# Altium footprint library controller_8266.PcbLib: 17 footprints (part 1 of 2)
Each footprint in its own frame and in the unit in brackets; x right, y up, seen from the top. Pads: shape width x height; smd on the part's side, far side on the other; paste and mask are expansions set on the pad; w line width, h text height; cw(c..) or ccw(c..) is an arc to the next point about the centre after c.
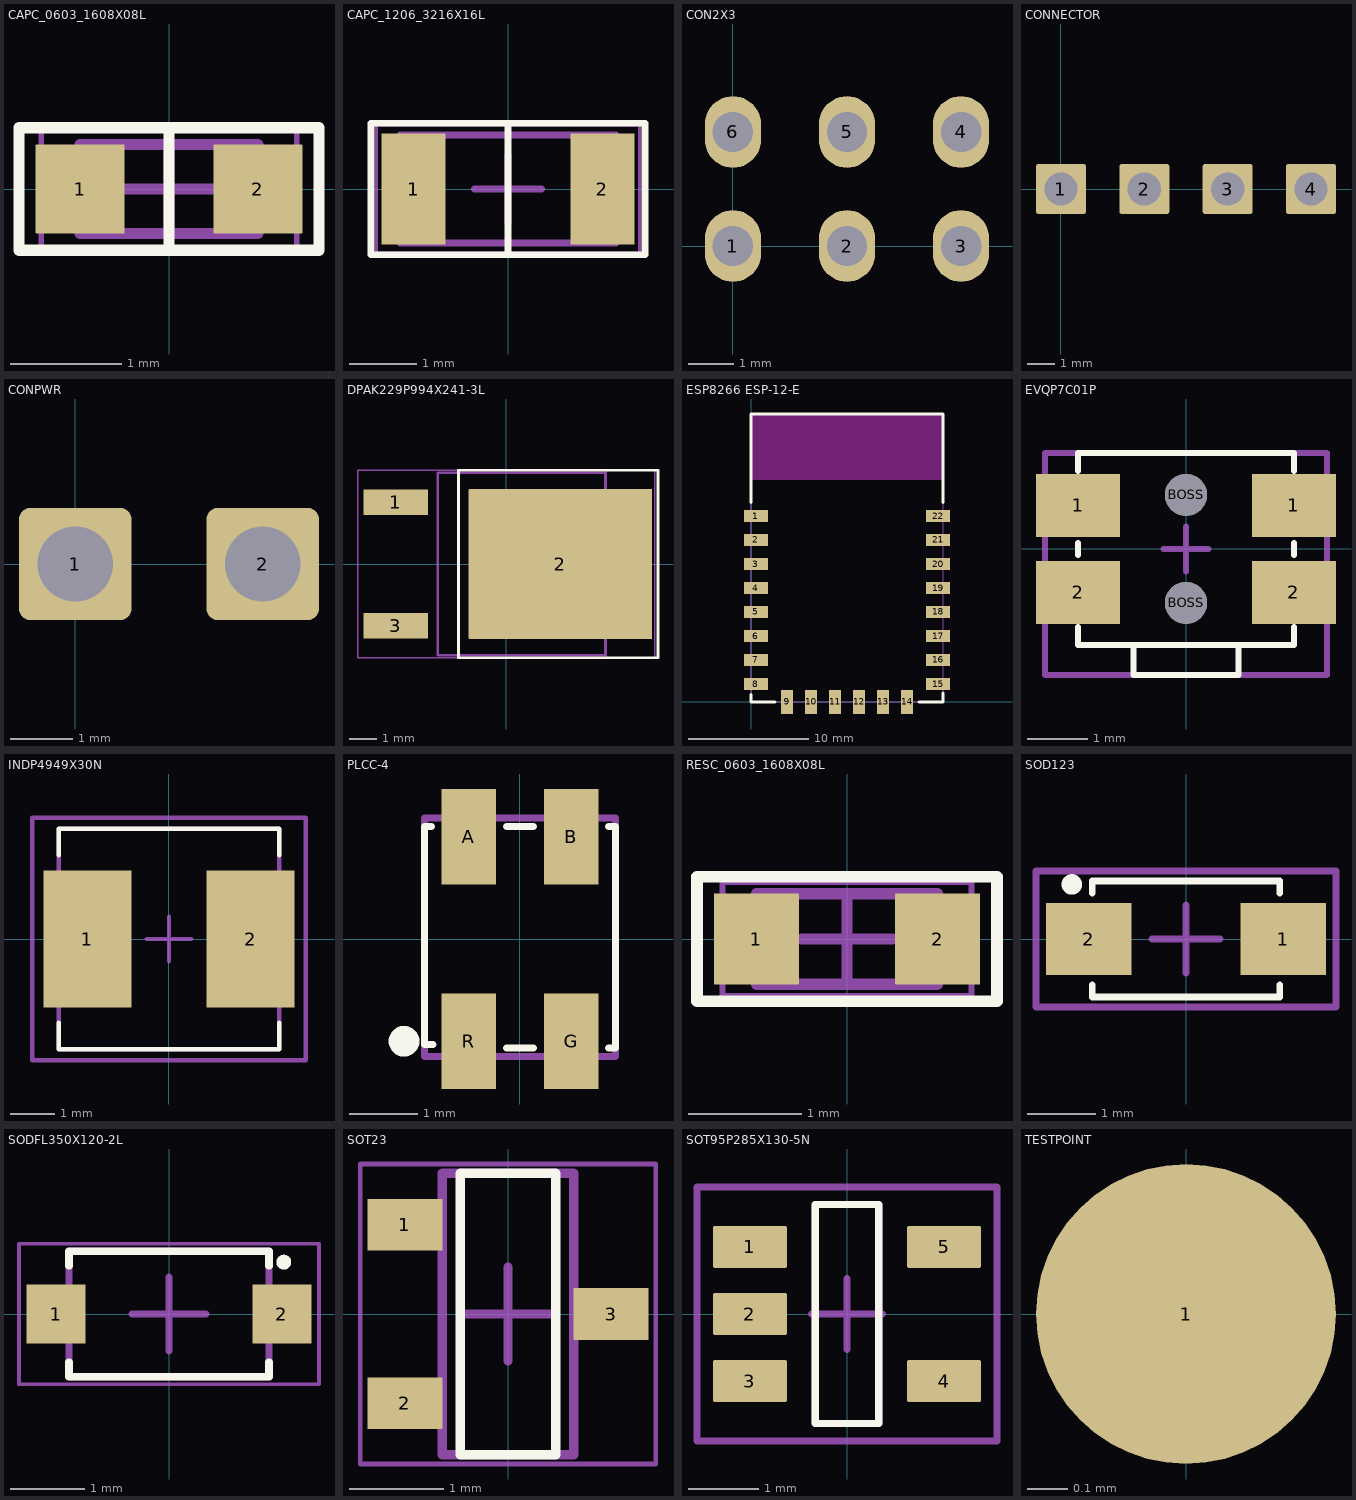
[diagram p0: the footprints below, top view; thin cyan lines are the x and y axes]

## CAPC_0603_1608X08L [mm] "Chip Capacitor 0603"
height 0.8
pads (2):
  rrect1% 0.8x0.8 smd: 1(-0.8,0) 2(0.8,0)
Top Overlay:
  lines w0.102: 0,-0.55 0,0.55 ; -1.35,-0.55 1.35,-0.55 1.35,0.55 -1.35,0.55 -1.35,-0.55
Top Courtyard:
  lines w0.05: -1.15,-0.55 1.15,-0.55 1.15,0.55 -1.15,0.55 -1.15,-0.55
  lines w0.1: -0.4,0 0.4,0 ; 0,-0.4 0,0.4
Top Component Outline:
  lines w0.1: -0.8,-0.4 0.8,-0.4 0.8,0.4 -0.8,0.4 -0.8,-0.4
3D body "CAPC_0603_1608X08L.step": height 0.8, standoff 0, extent -0.8,-0.4 0.8,0.4

## CAPC_1206_3216X16L [mm] "Chip Capacitor 1206"
height 1.6
pads (2):
  rrect1% 0.95x1.65 smd: 1(-1.4,0) 2(1.4,0)
Top Overlay:
  lines w0.102: 0,-0.975 0,0.975 ; -2.032,-0.975 2.032,-0.975 2.032,0.975 -2.032,0.975 -2.032,-0.975
Top Courtyard:
  lines w0.05: -1.95,-0.95 -1.95,0.95 1.95,0.95 1.95,-0.95 -1.95,-0.95
  lines w0.1: -0.5,0 0.5,0 ; 0,-0.5 0,0.5
Top Component Outline:
  lines w0.102: -1.6,-0.8 1.6,-0.8 1.6,0.8 -1.6,0.8 -1.6,-0.8
3D body "CAPC_1206_3216X16L.step": height 1.6, standoff 0, extent -1.6,-0.8 1.6,0.8

## CON2X3 [mm] "2x3 2.54mm"
pads (6):
  oval 1.25x1.6 hole 0.9 paste+0 mask+0: 1(0,0) 2(2.54,0) 3(5.08,0) 4(5.08,2.54) 5(2.54,2.54) 6(0,2.54)

## CONNECTOR [mm]
pads (4):
  rrect10% 1.8x1.8 hole 1.2 paste+0: 1(0,0) 2(3,0) 3(6,0) 4(9,0)

## CONPWR [mm]
pads (2):
  rrect20% 1.8x1.8 hole 1.2 paste+0: 1(0,0) 2(3,0)

## DPAK229P994X241-3L [mm] "D-PAK, 3-Pads, Body 6.21x6.73mm (max), IPC High Density"
height 2.41
pads (3):
  rrect1% 2.4x0.95 smd: 1(-4.1,2.29) 3(-4.1,-2.29)
  rrect1% 6.8x5.55 smd: 2(2,0)
Top Overlay:
  lines w0.102: -1.778,-3.475 5.613,-3.475 5.613,3.475 -1.778,3.475 -1.778,-3.475
Top Courtyard:
  lines w0.05: -5.5,-3.475 -5.5,3.475 5.5,3.475 5.5,-3.475 -5.5,-3.475
  lines w0.1: -0.5,0 0.5,0 ; 0,-0.5 0,0.5
Top Component Outline:
  lines w0.1: -2.55,-3.375 3.67,-3.375 3.67,3.375 -2.55,3.375 -2.55,-3.375
3D body "DPAK229P994X241-3L.step": height 2.56, standoff 0, extent -4.695,-3.375 5.245,3.375

## ESP8266 ESP-12-E [mm] "ESP8266 ESP-12-E"
pads (22):
  rrect1% 2x1 smd: 1(0.4,15.5) 2(0.4,13.5) 3(0.4,11.5) 4(0.4,9.5) 5(0.4,7.5) 6(0.4,5.5) 7(0.4,3.5) 8(0.4,1.5) 15(15.6,1.5) 16(15.6,3.5) 17(15.6,5.5) 18(15.6,7.5) 19(15.6,9.5) 20(15.6,11.5) 21(15.6,13.5) 22(15.6,15.5)
  rrect1% 1x2 smd: 9(3,0) 10(5,0) 11(7,0) 12(9,0) 13(11,0) 14(13,0)
Top Overlay:
  lines w0.254: 0,0.635 0,0 2,0 ; 0,16.637 0,24 16,24 16,16.637 ; 14,0 16,0 16,0.762
Keep-Out Layer:
  rectangle: 0,18.49 16,24
Top Courtyard:
  lines w0.025: 0,0 16,0 16,24 0,24 0,0
Top Component Outline:
  lines w0.102: 0,0 16,0 16,24 0,24 0,0
3D body "ESP-12F.STEP": height 3.17, standoff 0, extent 0,0 16,24

## EVQP7C01P [mm] "Side actuated tactile switch"
height 1.35
pads (6):
  rrect1% 1.4x1.05 smd mask+0.05: 1(-1.8,0.725) 1(1.8,0.725) 2(-1.8,-0.725) 2(1.8,-0.725)
  round 0.7 hole 0.7 unplated: BOSS(0,-0.9) BOSS(0,0.9)
Top Overlay:
  lines w0.102: -1.8,-1.3 -1.8,-1.6 1.8,-1.6 1.8,-1.3 ; -1.8,-0.1 -1.8,0.1 ; -1.8,1.3 -1.8,1.594 1.8,1.594 1.8,1.3 ; -0.875,-1.6 -0.875,-2.1 0.875,-2.1 0.875,-1.6 ; 1.8,-0.1 1.8,0.1
Top Courtyard:
  lines w0.102: -0.375,0 0.375,0 ; 0,-0.375 0,0.375 ; -2.35,-2.1 2.35,-2.1 2.35,1.594 -2.35,1.594 -2.35,-2.1
Top Component Outline:
  lines w0.102: -2.35,-2.1 2.35,-2.1 2.35,1.594 -2.35,1.594 -2.35,-2.1
3D body "EVQP7-LC-01P_FIXED.step": height 1.5, standoff -0.35, extent -2.35,-2.1 2.35,1.594

## INDP4949X30N [mm] "Precision Wire Wound Inductor, 2-Leads, Body 4.90x4.90mm, IPC Medium Density"
height 3
pads (2):
  rect 2x3.1 smd: 1(-1.85,0) 2(1.85,0)
Top Overlay:
  lines w0.102: -2.5,-1.901 -2.5,-2.5 2.5,-2.5 2.5,-1.901 ; -2.5,1.901 -2.5,2.5 2.5,2.5 2.5,1.901
Top Courtyard:
  lines w0.1: -0.5,0 0.5,0 ; 0,-0.5 0,0.5
  lines w0.102: -3.1,-2.75 -3.1,2.75 3.1,2.75 3.1,-2.75 -3.1,-2.75
Top Component Outline:
  lines w0.102: -2.5,-2.5 -2.5,2.5 2.5,2.5 2.5,-2.5 -2.5,-2.5
3D body "INDP4949X30N.step": height 3.1, standoff 0, extent -2.55,-2.45 2.55,2.45

## PLCC-4 [mm] "LED"
pads (4):
  rrect1% 0.8x1.4 smd: A(-0.75,1.5) B(0.75,1.5) G(0.75,-1.5) R(-0.75,-1.5)
Top Overlay:
  circle w0.25: c-1.7,-1.5 r0.1
  lines w0.102: -1.3,1.65 -1.4,1.65 -1.4,0.925 -1.4,-1.55 -1.275,-1.55 ; -0.2,-1.6 0.2,-1.6 ; -0.2,1.65 0.2,1.65 ; 1.3,-1.6 1.4,-1.6 1.4,1.65 1.3,1.65
Top Solder:
  rectangle: -1.2,-2.1 -0.3,-0.8
  rectangle: 0.3,-2.1 1.2,-0.8
  rectangle: 0.3,0.8 1.2,2.1
  rectangle: -1.2,0.8 -0.3,2.1
Top Component Outline:
  lines w0.102: -1.4,-1.725 -1.4,1.775 1.4,1.775 1.4,-1.725 -1.4,-1.725
3D body "CLV1AFKB(????????? RGB).STEP": height 1.9, standoff 0, extent -1.4,-1.725 1.4,1.775

## RESC_0603_1608X08L [mm] "Chip Resistor, 2-Leads, Body 1.60x0.80mm, IPC High Density"
height 0.8
pads (2):
  rrect1% 0.75x0.8 smd: 1(-0.8,0) 2(0.8,0)
Top Overlay:
  lines w0.102: -1.325,-0.55 1.325,-0.55 1.325,0.55 -1.325,0.55 -1.325,-0.55
Top Courtyard:
  lines w0.05: -1.1,-0.5 1.1,-0.5 1.1,0.5 -1.1,0.5 -1.1,-0.5
  lines w0.1: -0.4,0 0.4,0 ; 0,-0.4 0,0.4
Top Component Outline:
  lines w0.1: -0.8,-0.4 -0.8,0.4 0.8,0.4 0.8,-0.4 -0.8,-0.4
3D body "RESC_0603_1608X08L.step": height 0.8, standoff 0, extent -0.8,-0.4 0.8,0.4

## SOD123 [mm] "SOD123"
height 1.1
pads (2):
  rect 1.25x1.05 smd: 1(1.425,0) 2(-1.425,0)
Top Overlay:
  circle w0.2: c-1.675,0.8 r0.05
  lines w0.102: -1.375,-0.675 -1.375,-0.85 1.375,-0.85 1.375,-0.675 ; -1.375,0.675 -1.375,0.85 1.375,0.85 1.375,0.675
Top Courtyard:
  lines w0.1: -0.5,0 0.5,0 ; 0,-0.5 0,0.5
  lines w0.102: -2.2,-1 -2.2,1 2.2,1 2.2,-1 -2.2,-1
3D body "SOD123.step": height 1.1, standoff 0, extent -1.75,-0.85 1.75,0.85

## SODFL350X120-2L [mm] "SODFL, 2-Leads, Body 1.60x3.50mm, IPC High Density"
height 1.2
pads (2):
  rrect1% 0.8x0.8 smd: 1(-1.525,0) 2(1.525,0)
Top Overlay:
  circle w0.1: c1.55,0.7 r0.05
  lines w0.102: -1.35,-0.651 -1.35,-0.85 1.35,-0.85 1.35,-0.651 ; -1.35,0.651 -1.35,0.85 1.35,0.85 1.35,0.651
Top Courtyard:
  lines w0.05: -2.025,-0.95 -2.025,0.95 2.025,0.95 2.025,-0.95 -2.025,-0.95
  lines w0.1: -0.5,0 0.5,0 ; 0,-0.5 0,0.5
Top Component Outline:
  lines w0.1: -1.35,-0.85 -1.35,0.85 1.35,0.85 1.35,-0.85 -1.35,-0.85
3D body "SODFL350X120-2L.step": height 1.2, standoff 0, extent -1.75,-0.85 1.75,0.85

## SOT23 [mm] "SOT23, 3-Leads, Body 2.90x2.45mm, Pitch 0.95mm, IPC High Density"
height 1.1
pads (3):
  rrect1% 0.8x0.55 smd: 1(-1.1,0.95) 2(-1.1,-0.95) 3(1.1,0)
Top Overlay:
  lines w0.102: -0.508,-1.5 0.508,-1.5 0.508,1.5 -0.508,1.5 ; -0.508,-1.499 -0.508,1.499
Top Courtyard:
  lines w0.05: -1.575,-1.6 -1.575,1.6 1.575,1.6 1.575,-1.6 -1.575,-1.6
  lines w0.1: -0.5,0 0.5,0 ; 0,-0.5 0,0.5
Top Component Outline:
  lines w0.1: -0.7,-1.5 -0.7,1.5 0.7,1.5 0.7,-1.5 -0.7,-1.5
3D body "SOT23.step": height 1.1, standoff 0, extent -1.3,-1.5 1.3,1.5

## SOT95P285X130-5N [mm] "SOT23, 5-Leads, Body 3.00x2.85mm, Pitch 0.95mm, IPC Medium Density"
height 1.3
pads (5):
  rrect10% 1.05x0.6 smd: 1(-1.375,0.95) 2(-1.375,0) 3(-1.375,-0.95) 4(1.375,-0.95) 5(1.375,0.95)
Top Overlay:
  lines w0.102: -0.45,-1.55 -0.45,1.55 0.45,1.55 0.45,-1.55 -0.45,-1.55
Top Courtyard:
  lines w0.1: -0.5,0 0.5,0 ; 0,-0.5 0,0.5
  lines w0.102: -2.125,-1.8 2.125,-1.8 2.125,1.8 -2.125,1.8 -2.125,-1.8
Top Component Outline:
  lines w0.102: -0.45,-1.55 0.45,-1.55 0.45,1.55 -0.45,1.55 -0.45,-1.55
3D body "SOT95P285X130-5N.step": height 1.3, standoff 0, extent -1.5,-1.55 1.5,1.55

## TESTPOINT [mm]
pads (1):
  round 0.75 smd paste-10 mask+0: 1(0,0)